# Altium footprint library Connectors.PcbLib: 245 footprints (part 10 of 16)
Each footprint in its own frame and in the unit in brackets; x right, y up, seen from the top. Pads: shape width x height; smd on the part's side, far side on the other; paste and mask are expansions set on the pad; w line width, h text height; cw(c..) or ccw(c..) is an arc to the next point about the centre after c.
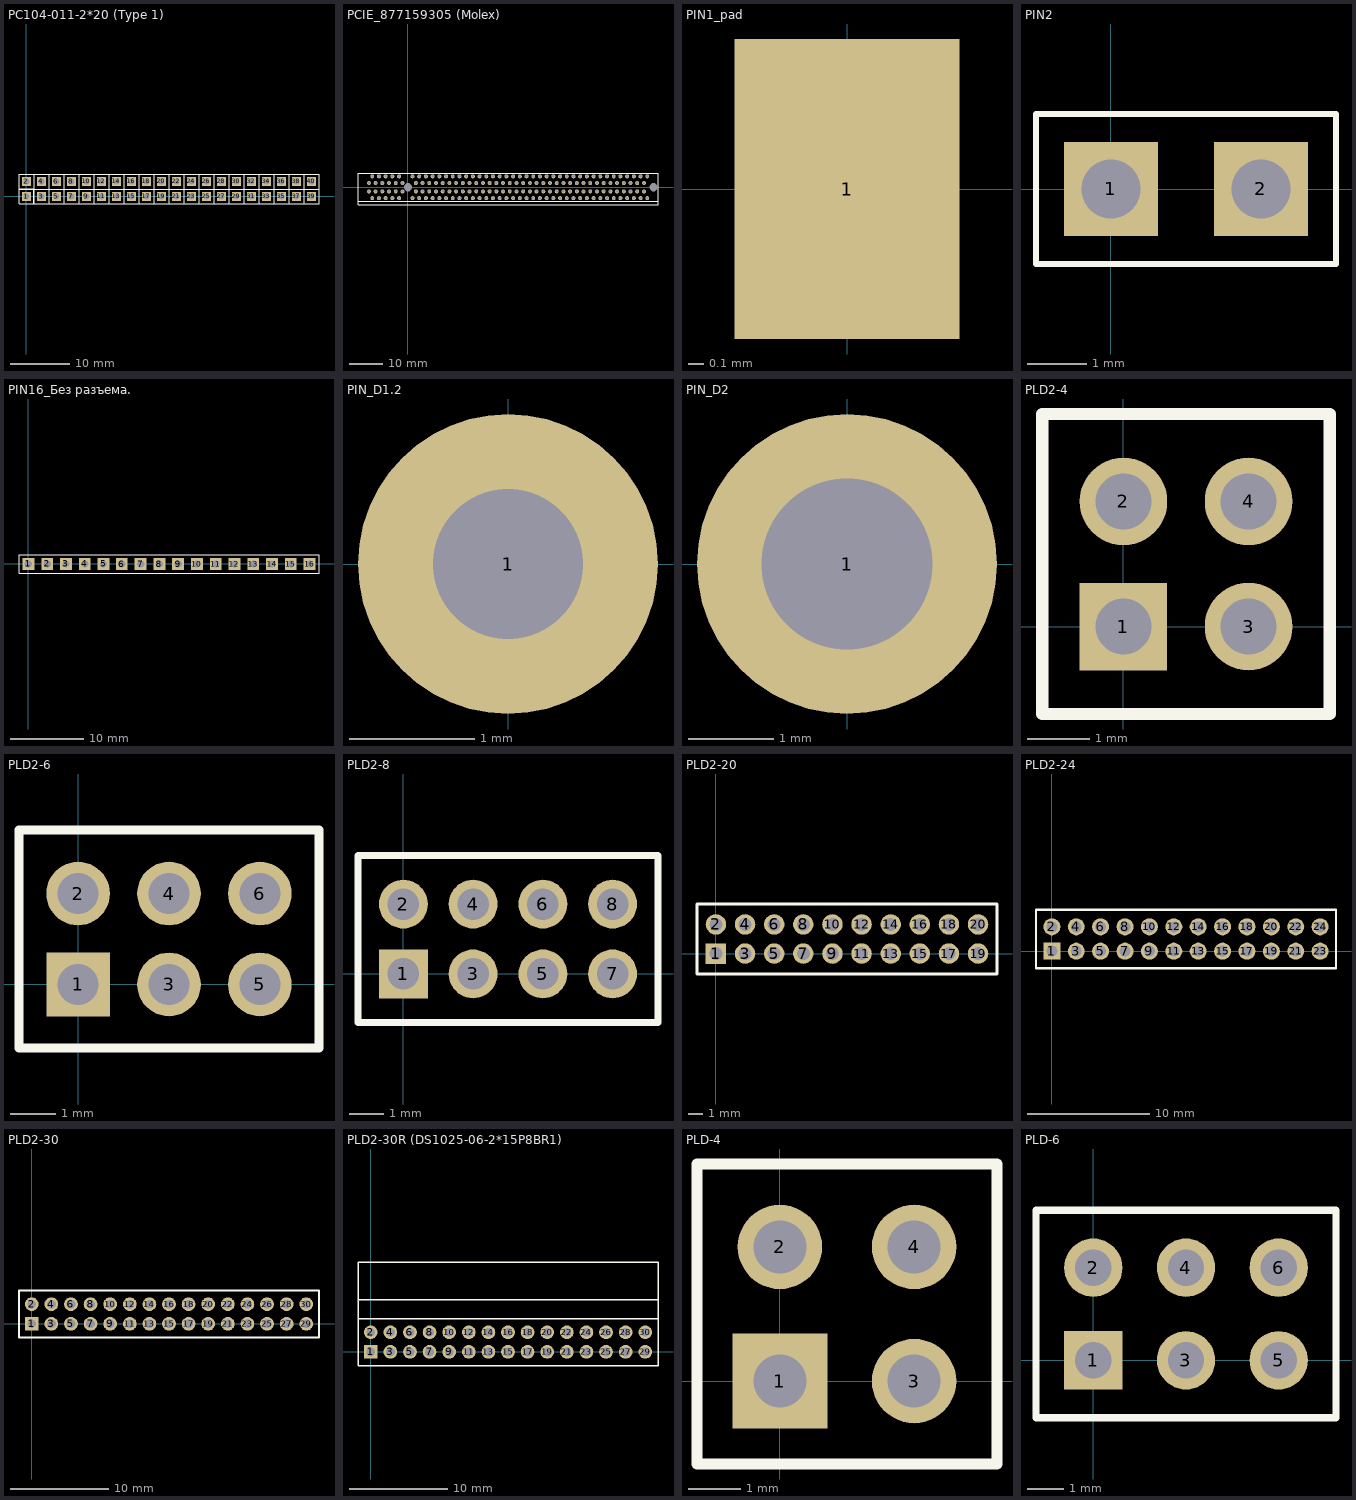
[diagram p9: the footprints below, top view; thin cyan lines are the x and y axes]

## PC104-011-2*20 (Type 1) [mm] "(Type 1 -  7.11mm / 16.13 mm)"
pads (40):
  rect 1.6x1.6 hole 1: 1(0,0) 2(0,2.54) 3(2.54,0) 4(2.54,2.54) 5(5.08,0) 6(5.08,2.54) 7(7.62,0) 8(7.62,2.54) 9(10.16,0) 10(10.16,2.54) 11(12.7,0) 12(12.7,2.54) 13(15.24,0) 14(15.24,2.54) 15(17.78,0) 16(17.78,2.54) 17(20.32,0) 18(20.32,2.54) 19(22.86,0) 20(22.86,2.54) 21(25.4,0) 22(25.4,2.54) 23(27.94,0) 24(27.94,2.54) 25(30.48,0) 26(30.48,2.54) 27(33.02,0) 28(33.02,2.54) 29(35.56,0) 30(35.56,2.54) 31(38.1,0) 32(38.1,2.54) 33(40.64,0) 34(40.64,2.54) 35(43.18,0) 36(43.18,2.54) 37(45.72,0) 38(45.72,2.54) 39(48.26,0) 40(48.26,2.54)
Top Overlay:
  drawing of 162 lines, arcs and shapes, not listed

## PCIE_877159305 (Molex) [mm]
pads (166):
  round 1.18 hole 0.78: A1(-11.65,1.25) A2(-10.65,3.25) A3(-9.65,1.25) A4(-8.65,3.25) A5(-7.65,1.25) A6(-6.65,3.25) A7(-5.65,1.25) A8(-4.65,3.25) A9(-3.65,1.25) A10(-2.65,3.25) A11(-1.65,1.25) A12(1.35,3.25) A13(2.35,1.25) A14(3.35,3.25) A15(4.35,1.25) A16(5.35,3.25) A17(6.35,1.25) A18(7.35,3.25) A19(8.35,1.25) A20(9.35,3.25) A21(10.35,1.25) A22(11.35,3.25) A23(12.35,1.25) A24(13.35,3.25) A25(14.35,1.25) A26(15.35,3.25) A27(16.35,1.25) A28(17.35,3.25) A29(18.35,1.25) A30(19.35,3.25) A31(20.35,1.25) A32(21.35,3.25) A33(22.35,1.25) A34(23.35,3.25) A35(24.35,1.25) A36(25.35,3.25) A37(26.35,1.25) A38(27.35,3.25) A39(28.35,1.25) A40(29.35,3.25) A41(30.35,1.25) A42(31.35,3.25) A43(32.35,1.25) A44(33.35,3.25) A45(34.35,1.25) A46(35.35,3.25) A47(36.35,1.25) A48(37.35,3.25) A49(38.35,1.25) A50(39.35,3.25) A51(40.35,1.25) A52(41.35,3.25) A53(42.35,1.25) A54(43.35,3.25) A55(44.35,1.25) A56(45.35,3.25) A57(46.35,1.25) A58(47.35,3.25) A59(48.35,1.25) A60(49.35,3.25) A61(50.35,1.25) A62(51.35,3.25) A63(52.35,1.25) A64(53.35,3.25) A65(54.35,1.25) A66(55.35,3.25) A67(56.35,1.25) A68(57.35,3.25) A69(58.35,1.25) A70(59.35,3.25) A71(60.35,1.25) A72(61.35,3.25) A73(62.35,1.25) A74(63.35,3.25) A75(64.35,1.25) A76(65.35,3.25) A77(66.35,1.25) A78(67.35,3.25) A79(68.35,1.25) A80(69.35,3.25) A81(70.35,1.25) A82(71.35,3.25) B1(-11.65,-1.25) B2(-10.65,-3.25) B3(-9.65,-1.25) B4(-8.65,-3.25) B5(-7.65,-1.25) B6(-6.65,-3.25) B7(-5.65,-1.25) B8(-4.65,-3.25) B9(-3.65,-1.25) B10(-2.65,-3.25) B11(-1.65,-1.25) B12(1.35,-3.25) B13(2.35,-1.25) B14(3.35,-3.25) B15(4.35,-1.25) B16(5.35,-3.25) B17(6.35,-1.25) B18(7.35,-3.25) B19(8.35,-1.25) B20(9.35,-3.25) B21(10.35,-1.25) B22(11.35,-3.25) B23(12.35,-1.25) B24(13.35,-3.25) B25(14.35,-1.25) B26(15.35,-3.25) B27(16.35,-1.25) B28(17.35,-3.25) B29(18.35,-1.25) B30(19.35,-3.25) B31(20.35,-1.25) B32(21.35,-3.25) B33(22.35,-1.25) B34(23.35,-3.25) B35(24.35,-1.25) B36(25.35,-3.25) B37(26.35,-1.25) B38(27.35,-3.25) B39(28.35,-1.25) B40(29.35,-3.25) B41(30.35,-1.25) B42(31.35,-3.25) B43(32.35,-1.25) B44(33.35,-3.25) B45(34.35,-1.25) B46(35.35,-3.25) B47(36.35,-1.25) B48(37.35,-3.25) B49(38.35,-1.25) B50(39.35,-3.25) B51(40.35,-1.25) B52(41.35,-3.25) B53(42.35,-1.25) B54(43.35,-3.25) B55(44.35,-1.25) B56(45.35,-3.25) B57(46.35,-1.25) B58(47.35,-3.25) B59(48.35,-1.25) B60(49.35,-3.25) B61(50.35,-1.25) B62(51.35,-3.25) B63(52.35,-1.25) B64(53.35,-3.25) B65(54.35,-1.25) B66(55.35,-3.25) B67(56.35,-1.25) B68(57.35,-3.25) B69(58.35,-1.25) B70(59.35,-3.25) B71(60.35,-1.25) B72(61.35,-3.25) B73(62.35,-1.25) B74(63.35,-3.25) B75(64.35,-1.25) B76(65.35,-3.25) B77(66.35,-1.25) B78(67.35,-3.25) B79(68.35,-1.25) B80(69.35,-3.25) B81(70.35,-1.25) B82(71.35,-3.25)
  round 1.18 hole 2.4 unplated: ""(0,0) ""(73.15,0)
Top Overlay:
  lines w0.2: -14.9,-4.2 74.55,-4.2 ; -14.9,-5.25 -14.9,4.2 74.55,4.2 74.55,-5.25 -14.9,-5.25
Bottom Overlay:
  text "B1" at -12.52,-1.73 h1.5
  text "B2" at -10.08,-5.05 h1.5
  text "A1" at -12.52,0.77 h1.5
  text "A2" at -10,4.36 h1.5
  text "A10" at -1.75,4.24 h1.5
  text "B10" at -1.73,-5.1 h1.5
  text "B11" at -0.03,-2.85 h1.5
  text "A11" at -0.05,1.96 h1.5
  text "A6" at -6.02,4.4 h1.5
  text "B6" at -6.02,-5.19 h1.5
  text "A12" at 2,4.36 h1.5
  text "A82" at 72.36,4.36 h1.5
  text "A20" at 10.38,4.28 h1.5
  text "A30" at 20,4.36 h1.5
  text "A40" at 30.37,4.36 h1.5
  text "A50" at 40.33,4.36 h1.5
  text "A60" at 50.34,4.37 h1.5
  text "A70" at 60.23,4.32 h1.5
  text "A81" at 72.95,1.17 h1.5
  text "B12" at 2.12,-5.1 h1.5
  text "B20" at 10.12,-5.1 h1.5
  text "B30" at 20.12,-5.1 h1.5
  text "B40" at 30.38,-5.07 h1.5
  text "B50" at 40.4,-5.13 h1.5
  text "B60" at 50.33,-5.14 h1.5
  text "B70" at 60.2,-5.11 h1.5
  text "B82" at 72.36,-5.11 h1.5
  text "B81" at 72.83,-2.08 h1.5
3D body "877159305.stp": height 11.26, standoff -4.34, extent -14.65,-5.125 74.35,3.725

## PIN1_pad [mm]
pads (1):
  rect 1.5x2 smd: 1(0,0)

## PIN2 [mm] "Отверстия на плате без разъема"
pads (2):
  rect 1.6x1.6 hole 1: 1(0,0) 2(2.54,0)
Top Overlay:
  lines w0.1: 3.81,-1.27 1.27,-1.27 -1.27,-1.27 -1.27,1.27 1.27,1.27 3.81,1.27 ; 3.81,-1.27 3.81,1.27 ; 3.81,-1.27 3.81,1.27

## PIN16_Без разъема. [mm] "Отверстия на плате без разъема. Пайка на шлейф или провода."
pads (16):
  rect 1.6x1.6 hole 1: 1(0,0) 2(2.54,0) 3(5.08,0) 4(7.62,0) 5(10.16,0) 6(12.63,-0.01) 7(15.17,-0.01) 8(17.71,-0.01) 9(20.25,-0.01) 10(22.79,-0.01) 11(25.33,-0.01) 12(27.87,-0.01) 13(30.41,-0.009) 14(32.95,-0.009) 15(35.49,-0.009) 16(38.03,-0.009)
Top Overlay:
  lines w0.1: 11.36,-1.28 13.9,-1.28 16.44,-1.28 18.98,-1.28 21.52,-1.28 24.06,-1.28 26.6,-1.28 29.14,-1.28 ; 11.36,1.26 13.9,1.26 16.44,1.26 18.98,1.26 21.52,1.26 24.06,1.26 26.6,1.26 29.14,1.26 ; 11.43,-1.27 8.89,-1.27 6.35,-1.27 3.81,-1.27 1.27,-1.27 -1.27,-1.27 -1.27,1.27 1.27,1.27 3.81,1.27 6.35,1.27 8.89,1.27 11.43,1.27 ; 29.14,-1.279 31.68,-1.279 34.22,-1.279 36.76,-1.279 39.3,-1.279 39.3,1.261 36.76,1.261 34.22,1.261 31.68,1.261 29.14,1.261

## PIN_D1.2 [mm]
pads (1):
  round 2.4 hole 1.2: 1(0,0)

## PIN_D2 [mm]
pads (1):
  round 3.5 hole 2: 1(0,0)

## PLD2-4 [mm]
pads (4):
  rect 1.4x1.4 hole 0.9: 1(0,0)
  round 1.4 hole 0.9: 2(0,2) 3(2,0) 4(2,2)
Top Overlay:
  lines w0.2: -1.3,-1.4 3.3,-1.4 3.3,3.4 -1.3,3.4 -1.3,-1.4
3D body "PLD2-4.step": height 5.5, standoff -2.6, extent -1,-1.1 3,3.1

## PLD2-6 [mm]
pads (6):
  rect 1.4x1.4 hole 0.9: 1(0,0)
  round 1.4 hole 0.9: 2(0,2) 3(2,0) 4(2,2) 5(4,0) 6(4,2)
Top Overlay:
  lines w0.2: -1.3,-1.4 -1.3,3.4 5.3,3.4 5.3,-1.4 -1.3,-1.4
3D body "PLD2-6.step": height 5.5, standoff -2.6, extent -1,-1.1 5,3.1

## PLD2-8 [mm]
pads (8):
  rect 1.4x1.4 hole 0.9: 1(0,0)
  round 1.4 hole 0.9: 2(0,2) 3(2,0) 4(2,2) 5(4,0) 6(4,2) 7(6,0) 8(6,2)
Top Overlay:
  lines w0.2: -1.3,-1.4 7.3,-1.4 7.3,3.4 -1.3,3.4 -1.3,-1.4
3D body "PLD2-8.step": height 5.5, standoff -2.6, extent -1,-1.1 7,3.1

## PLD2-20 [mm]
pads (20):
  rect 1.4x1.4 hole 0.9: 1(0,0)
  round 1.4 hole 0.9: 2(0,2) 3(2,0) 4(2,2) 5(4,0) 6(4,2) 7(6,0) 8(6,2) 9(8,0) 10(8,2) 11(10,0) 12(10,2) 13(12,0) 14(12,2) 15(14,0) 16(14,2) 17(16,0) 18(16,2) 19(18,0) 20(18,2)
Top Overlay:
  lines w0.2: -1.3,-1.4 -1.3,3.4 19.3,3.4 19.3,-1.4 -1.3,-1.4
3D body "PLD2-20.step": height 5.5, standoff -2.6, extent -1,-1.1 19,3.1

## PLD2-24 [mm]
pads (24):
  rect 1.4x1.4 hole 0.9: 1(0,0)
  round 1.4 hole 0.9: 2(0,2) 3(2,0) 4(2,2) 5(4,0) 6(4,2) 7(6,0) 8(6,2) 9(8,0) 10(8,2) 11(10,0) 12(10,2) 13(12,0) 14(12,2) 15(14,0) 16(14,2) 17(16,0) 18(16,2) 19(18,0) 20(18,2) 21(20,0) 22(20,2) 23(22,0) 24(22,2)
Top Overlay:
  lines w0.2: -1.3,-1.4 23.3,-1.4 23.3,3.4 -1.3,3.4 -1.3,-1.4
3D body "PLD2-24.step": height 5.5, standoff -2.6, extent -1,-1.1 23,3.1

## PLD2-30 [mm]
pads (30):
  rect 1.4x1.4 hole 0.9: 1(0,0)
  round 1.4 hole 0.9: 2(0,2) 3(2,0) 4(2,2) 5(4,0) 6(4,2) 7(6,0) 8(6,2) 9(8,0) 10(8,2) 11(10,0) 12(10,2) 13(12,0) 14(12,2) 15(14,0) 16(14,2) 17(16,0) 18(16,2) 19(18,0) 20(18,2) 21(20,0) 22(20,2) 23(22,0) 24(22,2) 25(24,0) 26(24,2) 27(26,0) 28(26,2) 29(28,0) 30(28,2)
Top Overlay:
  lines w0.2: -1.3,-1.4 29.3,-1.4 29.3,3.4 -1.3,3.4 -1.3,-1.4
3D body "PLD2-30.step": height 5.5, standoff -2.6, extent -1,-1.1 29,3.1

## PLD2-30R (DS1025-06-2*15P8BR1) [mm]
pads (30):
  rect 1.4x1.4 hole 0.9: 1(0,0)
  round 1.4 hole 0.9: 2(0,2) 3(2,0) 4(2,2) 5(4,0) 6(4,2) 7(6,0) 8(6,2) 9(8,0) 10(8,2) 11(10,0) 12(10,2) 13(12,0) 14(12,2) 15(14,0) 16(14,2) 17(16,0) 18(16,2) 19(18,0) 20(18,2) 21(20,0) 22(20,2) 23(22,0) 24(22,2) 25(24,0) 26(24,2) 27(26,0) 28(26,2) 29(28,0) 30(28,2)
Top Overlay:
  lines w0.15: -1.3,3.4 -1.3,5.3 ; -1.3,3.4 29.3,3.4 ; -1.3,3.4 -1.3,-1.4 29.3,-1.4 29.3,3.4 ; -1.3,5.3 -1.3,9.127 29.3,9.127 29.3,5.3 ; -1.3,5.3 0,5.3 29.3,5.3 ; 29.3,3.4 29.3,5.3
3D body "User Library-PLD2-xx-R.step": height 4, standoff -2.8, extent -0.993,-0.242 29.007,9.008

## PLD-4 [mm]
pads (4):
  rect 1.8x1.8 hole 1: 1(0,0)
  round 1.6 hole 1: 2(0,2.54) 3(2.54,0) 4(2.54,2.54)
Top Overlay:
  lines w0.2: -1.57,-1.57 -1.57,4.11 4.11,4.11 4.11,-1.57 -1.57,-1.57
3D body "PLD-4.stp": height 8.7, standoff -3, extent -1.27,-1.27 3.81,3.81

## PLD-6 [mm]
pads (6):
  rect 1.6x1.6 hole 1: 1(0,0)
  round 1.6 hole 1: 2(0,2.54) 3(2.54,0) 4(2.54,2.54) 5(5.08,0) 6(5.08,2.54)
Top Overlay:
  lines w0.2: -1.57,-1.57 6.65,-1.57 6.65,4.11 -1.57,4.11 -1.57,-1.57
3D body "PLD-6.stp": height 8.7, standoff -3, extent -1.27,-1.27 6.35,3.81